# Altium footprint library NEW.PcbLib: 53 footprints (part 3 of 4)
Each footprint in its own frame and in the unit in brackets; x right, y up, seen from the top. Pads: shape width x height; smd on the part's side, far side on the other; paste and mask are expansions set on the pad; w line width, h text height; cw(c..) or ccw(c..) is an arc to the next point about the centre after c.
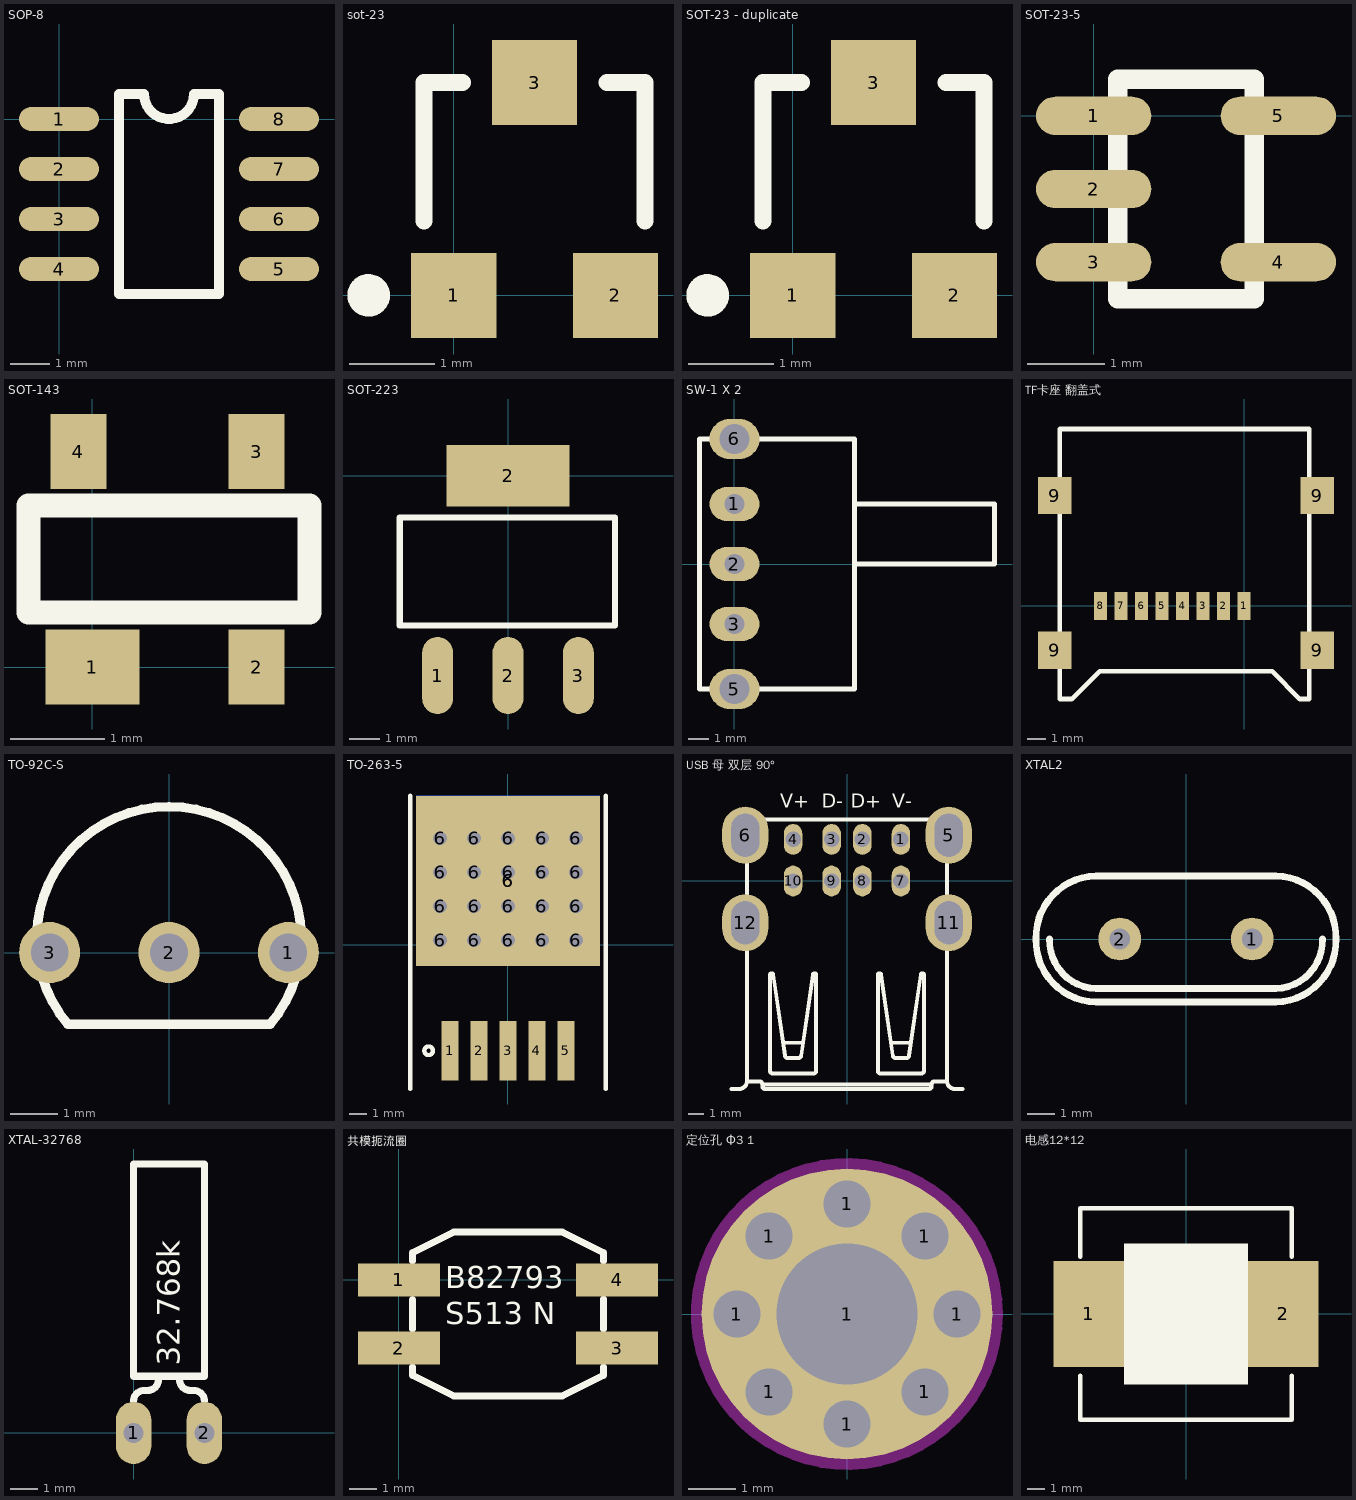
[diagram p2: the footprints below, top view; thin cyan lines are the x and y axes]

## SOP-8 [mil]
height 39.37
pads (8):
  oval 80x24 smd: 1(0,0) 2(0,-50) 3(0,-100) 4(0,-150) 5(220,-150) 6(220,-100) 7(220,-50) 8(220,0)
Top Overlay:
  lines w10: 60,-175 160,-175 160,25 135,25 cw(c110,25) 85,25 60,25 60,-175
3D body: height 73.87, standoff -1.02, extent -14.77,-173.25 234.78,23.75

## sot-23 [mm]
height 1
pads (3):
  rect 1x1 smd: 1(0,0) 2(1.9,0) 3(0.95,2.5)
Top Overlay:
  circle w0.25: c-1,0 r0.125
  lines w0.2: -0.35,0.875 -0.35,2.5 0.1,2.5 ; 1.8,2.5 2.25,2.5 2.25,0.875
3D body: height 1.2, standoff 0, extent -0.5,-0.15 2.4,2.65

## SOT-23 - duplicate [mm]
pads (3):
  rect 1x1 smd: 1(0,0) 2(1.9,0) 3(0.95,2.5)
Top Overlay:
  circle w0.25: c-1,0 r0.125
  lines w0.2: -0.35,0.875 -0.35,2.5 0.1,2.5 ; 1.8,2.5 2.25,2.5 2.25,0.875
3D body: height 1.2, standoff 0, extent -0.5,-0.15 2.4,2.65

## SOT-23-5 [mm]
height 1.45
pads (5):
  oval 1.5x0.5 smd: 1(0,0) 2(0,-0.95) 3(0,-1.9) 4(2.4,-1.9) 5(2.4,0)
Top Overlay:
  lines w0.254: 0.962,-2.375 2.089,-2.375 2.089,0.475 0.311,0.475 0.311,-2.375 1.438,-2.375
3D body: height 1.2, standoff 0, extent -0.2,-2.4 2.6,0.5

## SOT-143 [mm]
pads (4):
  rect 1x0.8 smd: 1(0,0)
  rect 0.6x0.8 smd: 2(1.75,0) 3(1.75,2.3) 4(-0.15,2.3)
Top Overlay:
  lines w0.254: -0.683,0.583 -0.683,1.726 2.317,1.726 2.317,0.583 -0.683,0.583
3D body: height 1, standoff 0, extent -0.66,-0.06 2.26,2.36

## SOT-223 [mm]
pads (4):
  oval 1x2.5 smd: 1(-2.29,-6.5) 2(0,-6.5) 3(2.29,-6.5)
  rect 4x2 smd: 2(0,0)
Top Overlay:
  lines w0.2: -3.519,-4.869 -3.519,-1.369 3.481,-1.369 3.481,-4.869 -3.519,-4.869
3D body: height 1.68, standoff 0, extent -3.25,-6.782 3.25,0.178

## SW-1 X 2 [mm]
pads (5):
  oval 2.5x1.7 hole 1: 1(0,3) 2(0,0) 3(0,-3)
  oval 2.5x2 hole 1.5: 5(0,-6.25) 6(0,6.25)
Top Overlay:
  lines w0.254: 6,0 13,0 13,3 6,3 ; -1.75,-6.25 0,-6.25 6,-6.25 6,6.25 0,6.25 -1.5,6.25 -1.75,6.25 -1.75,-6.25
3D body: height 5.75, standoff -3.35, extent -0.608,-6.523 12.292,6.477

## TF卡座 翻盖式 [mm]
height 2
pads (12):
  rect 0.7x1.5 smd: 1(0,0) 2(-1.1,0) 3(-2.2,0) 4(-3.3,0) 5(-4.4,0) 6(-5.5,0) 7(-6.6,0) 8(-7.7,0)
  rect 1.8x2 smd: 9(-10.168,-2.378) 9(-10.168,5.922) 9(3.932,-2.378) 9(3.932,5.922)
Top Overlay:
  lines w0.254: -9.9,-5 -9.9,9.5 0,9.5 3.5,9.5 3.5,-5 3,-5 1.5,-3.5 -7.75,-3.5 -9.25,-5 -9.9,-5
3D body: height 1.93, standoff -0.02, extent -10.5,-5 4.1,9.5

## TO-92C-S [mm]
height 10
pads (3):
  round 1.3 hole 0.8: 1(2.54,0) 2(0,0) 3(-2.54,0)
Top Overlay:
  lines w0.2: -2.157,-1.522 cw(c0,0.288) 2.157,-1.522 -2.157,-1.522
3D body: height 10.33, standoff -7.7, extent -2.888,-1.53 2.852,2.66

## TO-263-5 [mm]
height 5
pads (27):
  rect 1x3.5 smd: 1(-3.4,-6.25) 2(-1.7,-6.25) 3(0,-6.25) 4(1.7,-6.25) 5(3.4,-6.25)
  round 1.5 hole 0.8: 6(-4,0.25) 6(-4,2.25) 6(-4,4.25) 6(-4,6.25) 6(-2,0.25) 6(-2,2.25) 6(-2,4.25) 6(-2,6.25) 6(0,0.25) 6(0,2.25) 6(0,4.25) 6(0,6.25) 6(2,0.25) 6(2,2.25) 6(2,4.25) 6(2,6.25) 6(4,0.25) 6(4,2.25) 6(4,4.25) 6(4,6.25)
  rect 10.8x10 smd: 6(0,3.75)
  rect 10.8x10 smd far side: 6(0,3.75)
Top Overlay:
  circle w0.254: c-4.67,-6.25 r0.254
  lines w0.254: -5.75,-8.5 -5.75,8.75 ; 5.75,-8.5 5.75,8.75
3D body: height 4.56, standoff 0, extent -5.08,-6.5 5.08,7.515

## USB 母 双层 90° [mm] "HW-UAF-25"
height 17
pads (12):
  oval 1.2x2 hole 1: 1(3.5,2.7) 2(1,2.7) 3(-1,2.7) 4(-3.5,2.7) 7(3.5,0) 8(1,0) 9(-1,0) 10(-3.5,0)
  oval 3x3.7 hole 1.8 slot 2.8 at 90 deg: 5(6.6,2.97) 6(-6.6,2.97) 11(6.6,-2.71) 12(-6.6,-2.71)
Top Overlay:
  lines w0.254: -7.5,-13.5 -7,-13.5 ccw(c-7,-13) -6.5,-13 ; -6.5,-4.3 -6.5,-13 ; -6.5,-1.3 -6.5,0.5 -6.5,4 ; -4.15,-10.5 -2.849,-10.5 ; 2.85,-10.5 4.151,-10.5 ; 6.5,-4.3 6.5,-13 ; 6.5,-1.3 6.5,0.5 6.5,4 ; 7.5,-13.5 7,-13.5 cw(c7,-13) 6.5,-13 ; -6.5,-13 -5.7,-13 cw(c-5.7,-13.2) -5.5,-13.2 ; -6.5,4 -6.5,4 ; -6.5,4 6.5,4 ; -5.5,-13.2 5.5,-13.2 ; -5.5,-13.2 -5.5,-13.3 ccw(c-5.3,-13.3) -5.3,-13.5 5.3,-13.5 ccw(c5.3,-13.3) 5.5,-13.3 5.5,-13.2 ; 5.5,-13.2 cw(c5.7,-13.2) 5.7,-13 6.5,-13 ; 6.5,4 6.5,4 ; -5,-12.3 ccw(c-4.8,-12.3) -4.8,-12.5 -2.2,-12.5 ccw(c-2.2,-12.3) -2,-12.3 -2,-6.1 ccw(c-2.1,-6.1) -2.1,-6 -2.113,-6 ccw(c-2.113,-6.1) -2.212,-6.086 -2.97,-11.336 cw(c-3.167,-11.3) -3.167,-11.5 -3.833,-11.5 cw(c-3.833,-11.3) -4.03,-11.336 -4.788,-6.086 ccw(c-4.887,-6.1) -4.887,-6 -4.9,-6 ccw(c-4.9,-6.1) -5,-6.1 -5,-12.3 ; 2,-12.3 ccw(c2.2,-12.3) 2.2,-12.5 4.8,-12.5 ccw(c4.8,-12.3) 5,-12.3 5,-6.1 ccw(c4.9,-6.1) 4.9,-6 4.887,-6 ccw(c4.887,-6.1) 4.788,-6.086 4.03,-11.336 cw(c3.833,-11.3) 3.833,-11.5 3.167,-11.5 cw(c3.167,-11.3) 2.97,-11.336 2.212,-6.086 ccw(c2.113,-6.1) 2.113,-6 2.1,-6 ccw(c2.1,-6.1) 2,-6.1 2,-12.3
  text "V+" at -4.318,4.445 h1.52
  text "V-" at 2.921,4.445 h1.52
  text "D+" at 0.254,4.445 h1.52
  text "D-" at -1.651,4.445 h1.52
3D body: height 16.43, standoff -4.07, extent -7.72,-13.54 7.72,4.826

## XTAL2 [mil]
pads (2):
  round 62 hole 30: 1(96.06,0) 2(-96.06,0)
Top Overlay:
  lines w10: -197.83,0 ccw(c-128.25,-2.26) -130.51,-71.85 130.51,-71.85 ccw(c128.25,-2.26) 197.83,0 ; -217.52,0 ccw(c-128.25,-2.26) -130.51,-91.54 130.51,-91.54 ccw(c128.25,-2.26) 217.52,0 ccw(c128.25,2.26) 130.51,91.54 -130.51,91.54 ccw(c-128.25,2.26) -217.52,0
3D body: height 141.73, standoff -153.54, extent -223.43,-91.54 223.43,91.54

## XTAL-32768 [mil]
pads (2):
  oval 50x88 hole 28: 1(0,0) 2(100,0)
Top Overlay:
  lines w10: 0,45 cw(c15,45) 15,60 20,60 ccw(c20,75) 35,75 ; 65,75 ccw(c80,75) 80,60 85,60 cw(c85,45) 100,45 ; 0,80 100,80 100,380 0,380 0,80
  text "32.768k" at 65,95 h32
3D body: height 125.98, standoff 0, extent -17.91,-28.43 117.91,395.79

## 共模扼流圈 [mm] "B82793S0513N201"
height 4.9
pads (4):
  rect 3x1.2 smd: 1(0,0) 2(0,-2.5) 3(8,-2.5) 4(8,0)
Top Overlay:
  lines w0.254: 0.5,-3.2 0.5,-3.3 0.5,-3.5 2,-4.25 6,-4.25 7.5,-3.5 7.5,-3.3 7.5,-3.2 ; 0.5,-1.8 0.5,-0.724 ; 0.5,0.7 0.5,1 2,1.75 6,1.75 7.5,1 7.5,0.7 ; 7.5,-1.8 7.5,-0.8 7.5,-0.7
  text "B82793" at 1.7,-0.3 h0.81
  text "S513 N" at 1.7,-1.625 h0.81
3D body: height 5, standoff -0.15, extent -0.5,-4.25 8.5,1.75

## 定位孔 Φ3 1 [mm]
pads (9):
  round 1 hole 1: 1(-2.35,0) 1(-1.662,-1.662) 1(-1.662,1.662) 1(0,-2.35) 1(0,2.35) 1(1.662,-1.662) 1(1.662,1.662) 1(2.35,0)
  round 6.2 hole 3: 1(0,0)
Keep-Out Layer:
  circle w0.254: c0,0 r3.2

## 电感12*12 [mm]
height 7
pads (2):
  rect 4x6 smd: 1(-5.5,0) 2(5.5,0)
Top Overlay:
  rectangle: -3.5,-4 3.5,4
  lines w0.254: -6,-3.5 -6,-6 6,-6 6,-3.5 ; -6,3.25 -6,6 6,6 6,3.25
3D body: height 6.1, standoff -0.05, extent -6.15,-6.15 6.15,6.15